# Altium footprint library Connector.PcbLib: 536 footprints (part 21 of 34)
Each footprint in its own frame and in the unit in brackets; x right, y up, seen from the top. Pads: shape width x height; smd on the part's side, far side on the other; paste and mask are expansions set on the pad; w line width, h text height; cw(c..) or ccw(c..) is an arc to the next point about the centre after c.
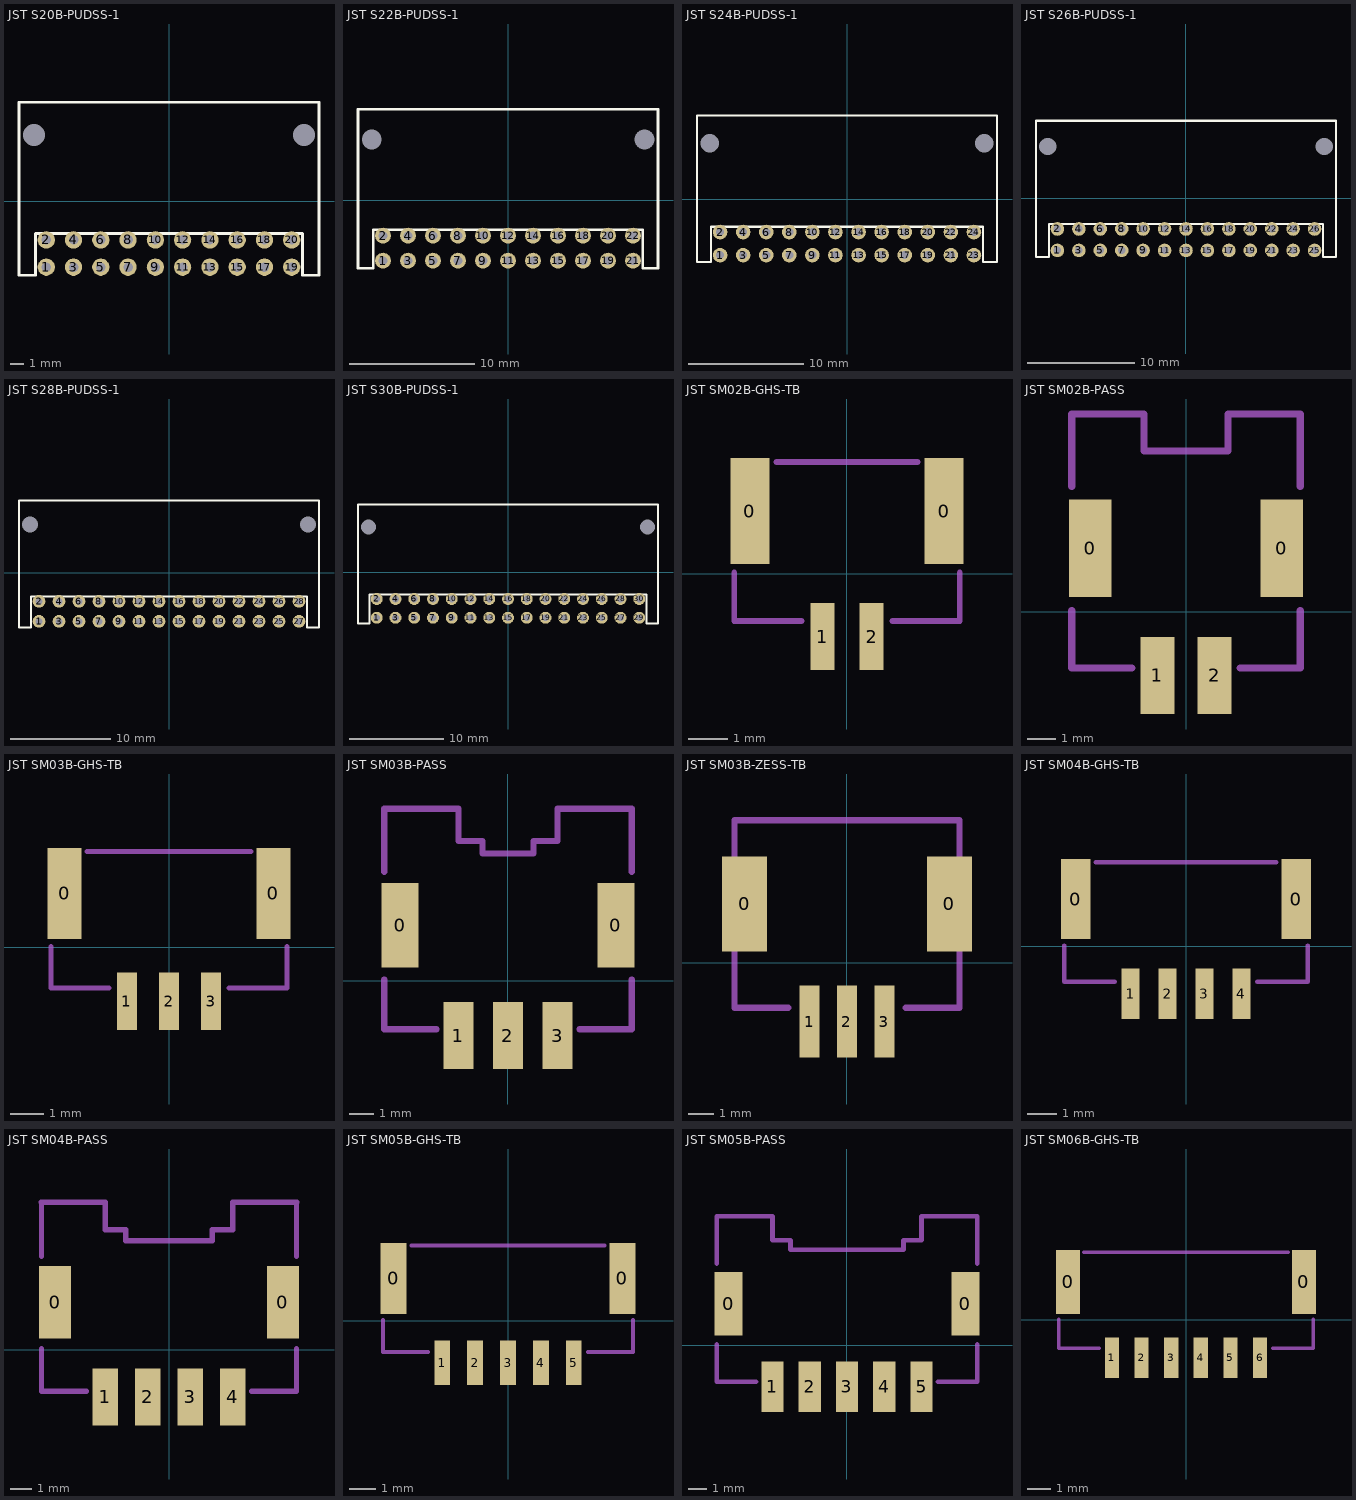
[diagram p20: the footprints below, top view; thin cyan lines are the x and y axes]

## JST S20B-PUDSS-1 [mm]
pads (22):
  round 0 hole 1.6: 0(-9.9,4.85) 0(9.9,4.85)
  round 1.27 hole 0.7: 1(-9,-4.85) 2(-9,-2.85) 3(-7,-4.85) 4(-7,-2.85) 5(-5,-4.85) 6(-5,-2.85) 7(-3,-4.85) 8(-3,-2.85) 9(-1,-4.85) 10(-1,-2.85) 11(1,-4.85) 12(1,-2.85) 13(3,-4.85) 14(3,-2.85) 15(5,-4.85) 16(5,-2.85) 17(7,-4.85) 18(7,-2.85) 19(9,-4.85) 20(9,-2.85)
Top Overlay:
  lines w0.203: -11,-5.45 -9.787,-5.45 -9.787,-2.386 9.787,-2.386 9.787,-5.45 11,-5.45 11,7.25 -11,7.25 -11,-5.45
3D body "S20B-PUDSS-1.STEP": height 8.52, standoff -2.98, extent -11,-5.45 11,7.25

## JST S22B-PUDSS-1 [mm]
pads (24):
  round 0 hole 1.6: 0(-10.9,4.85) 0(10.9,4.85)
  round 1.27 hole 0.7: 1(-10,-4.85) 2(-10,-2.85) 3(-8,-4.85) 4(-8,-2.85) 5(-6,-4.85) 6(-6,-2.85) 7(-4,-4.85) 8(-4,-2.85) 9(-2,-4.85) 10(-2,-2.85) 11(0,-4.85) 12(0,-2.85) 13(2,-4.85) 14(2,-2.85) 15(4,-4.85) 16(4,-2.85) 17(6,-4.85) 18(6,-2.85) 19(8,-4.85) 20(8,-2.85) 21(10,-4.85) 22(10,-2.85)
Top Overlay:
  lines w0.203: -12,-5.45 -10.787,-5.45 -10.787,-2.386 10.787,-2.386 10.787,-5.45 12,-5.45 12,7.25 -12,7.25 -12,-5.45
3D body "S22B-PUDSS-1.STEP": height 8.52, standoff -2.98, extent -12,-5.45 12,7.25

## JST S24B-PUDSS-1 [mm]
pads (26):
  round 0 hole 1.6: 0(-11.9,4.85) 0(11.9,4.85)
  round 1.27 hole 0.7: 1(-11,-4.85) 2(-11,-2.85) 3(-9,-4.85) 4(-9,-2.85) 5(-7,-4.85) 6(-7,-2.85) 7(-5,-4.85) 8(-5,-2.85) 9(-3,-4.85) 10(-3,-2.85) 11(-1,-4.85) 12(-1,-2.85) 13(1,-4.85) 14(1,-2.85) 15(3,-4.85) 16(3,-2.85) 17(5,-4.85) 18(5,-2.85) 19(7,-4.85) 20(7,-2.85) 21(9,-4.85) 22(9,-2.85) 23(11,-4.85) 24(11,-2.85)
Top Overlay:
  lines w0.203: -13,-5.45 -11.787,-5.45 -11.787,-2.386 11.787,-2.386 11.787,-5.45 13,-5.45 13,7.25 -13,7.25 -13,-5.45
3D body "S24B-PUDSS-1.STEP": height 8.52, standoff -2.98, extent -13,-5.45 13,7.25

## JST S26B-PUDSS-1 [mm]
pads (28):
  round 0 hole 1.6: 0(-12.9,4.85) 0(12.9,4.85)
  round 1.27 hole 0.7: 1(-12,-4.85) 2(-12,-2.85) 3(-10,-4.85) 4(-10,-2.85) 5(-8,-4.85) 6(-8,-2.85) 7(-6,-4.85) 8(-6,-2.85) 9(-4,-4.85) 10(-4,-2.85) 11(-2,-4.85) 12(-2,-2.85) 13(0,-4.85) 14(0,-2.85) 15(2,-4.85) 16(2,-2.85) 17(4,-4.85) 18(4,-2.85) 19(6,-4.85) 20(6,-2.85) 21(8,-4.85) 22(8,-2.85) 23(10,-4.85) 24(10,-2.85) 25(12,-4.85) 26(12,-2.85)
Top Overlay:
  lines w0.203: -14,-5.45 -14,7.25 14,7.25 14,-5.45 12.787,-5.45 12.787,-2.386 -12.787,-2.386 -12.787,-5.45 -14,-5.45
3D body "S26B-PUDSS-1.STEP": height 8.52, standoff -2.98, extent -14,-5.45 14,7.25

## JST S28B-PUDSS-1 [mm]
pads (30):
  round 0 hole 1.6: 0(-13.9,4.85) 0(13.9,4.85)
  round 1.27 hole 0.7: 1(-13,-4.85) 2(-13,-2.85) 3(-11,-4.85) 4(-11,-2.85) 5(-9,-4.85) 6(-9,-2.85) 7(-7,-4.85) 8(-7,-2.85) 9(-5,-4.85) 10(-5,-2.85) 11(-3,-4.85) 12(-3,-2.85) 13(-1,-4.85) 14(-1,-2.85) 15(1,-4.85) 16(1,-2.85) 17(3,-4.85) 18(3,-2.85) 19(5,-4.85) 20(5,-2.85) 21(7,-4.85) 22(7,-2.85) 23(9,-4.85) 24(9,-2.85) 25(11,-4.85) 26(11,-2.85) 27(13,-4.85) 28(13,-2.85)
Top Overlay:
  lines w0.203: -15,-5.45 -15,7.25 15,7.25 15,-5.45 13.787,-5.45 13.787,-2.386 -13.787,-2.386 -13.787,-5.45 -15,-5.45
3D body "S28B-PUDSS-1.STEP": height 8.52, standoff -2.98, extent -15,-5.45 15,7.25

## JST S30B-PUDSS-1 [mm]
pads (32):
  round 0 hole 1.6: 0(-14.9,4.85) 0(14.9,4.85)
  round 1.27 hole 0.7: 1(-14,-4.85) 2(-14,-2.85) 3(-12,-4.85) 4(-12,-2.85) 5(-10,-4.85) 6(-10,-2.85) 7(-8,-4.85) 8(-8,-2.85) 9(-6,-4.85) 10(-6,-2.85) 11(-4,-4.85) 12(-4,-2.85) 13(-2,-4.85) 14(-2,-2.85) 15(0,-4.85) 16(0,-2.85) 17(2,-4.85) 18(2,-2.85) 19(4,-4.85) 20(4,-2.85) 21(6,-4.85) 22(6,-2.85) 23(8,-4.85) 24(8,-2.85) 25(10,-4.85) 26(10,-2.85) 27(12,-4.85) 28(12,-2.85) 29(14,-4.85) 30(14,-2.85)
Top Overlay:
  lines w0.203: -16,-5.45 -14.787,-5.45 -14.787,-2.386 14.787,-2.386 14.787,-5.45 16,-5.45 16,7.25 -16,7.25 -16,-5.45
3D body "S30B-PUDSS-1.STEP": height 8.52, standoff -2.98, extent -16,-5.45 16,7.25

## JST SM02B-GHS-TB [mm]
pads (4):
  rect 1x2.7 smd: 0(-2.475,1.6) 0(2.475,1.6)
  rect 0.6x1.7 smd: 1(-0.625,-1.6) 2(0.625,-1.6)
Mechanical 15:
  lines w0.15: -2.875,0.031 -2.875,-1.2 -1.158,-1.2 ; -1.8,2.85 1.8,2.85 ; 1.158,-1.2 2.875,-1.2 2.875,0.031
3D body "SM02B-GHS-TB.STEP": height 4.35, standoff 0, extent -2.875,-2 2.875,2.85

## JST SM02B-PASS [mm]
pads (4):
  rect 1.5x3.4 smd: 0(-3.35,2.225) 0(3.35,2.225)
  rect 1.2x2.7 smd: 1(-1,-2.225) 2(1,-2.225)
Mechanical 15:
  lines w0.254: -4,6.919 -3.994,6.925 ; -3.994,0.042 -3.994,-1.965 -1.886,-1.965 ; -3.994,4.385 -3.994,6.925 ; 1.886,-1.965 3.994,-1.965 3.994,0.042 ; 3.994,4.385 3.994,6.925 ; -3.994,6.925 -1.473,6.925 -1.473,5.63 1.473,5.63 1.473,6.925 3.994,6.925 ; 3.994,6.925 4,6.919 3.994,6.925
3D body "SM02B-PASS-TB.STEP": height 5.8, standoff 0, extent -3.994,-3.075 4.006,6.925

## JST SM03B-GHS-TB [mm]
pads (5):
  rect 1x2.7 smd: 0(-3.1,1.6) 0(3.1,1.6)
  rect 0.6x1.7 smd: 1(-1.25,-1.6) 2(0,-1.6) 3(1.25,-1.6)
Mechanical 15:
  lines w0.15: -3.5,0.031 -3.5,-1.2 -1.783,-1.2 ; -2.425,2.85 1.175,2.85 ; -1.175,2.85 2.425,2.85 ; 1.783,-1.2 3.5,-1.2 3.5,0.031
3D body "SM03B-GHS-TB.STEP": height 4.35, standoff 0, extent -3.5,-2 3.5,2.85

## JST SM03B-PASS [mm]
pads (5):
  rect 1.5x3.4 smd: 0(-4.35,2.225) 0(4.35,2.225)
  rect 1.2x2.7 smd: 1(-2,-2.225) 2(0,-2.225) 3(2,-2.225)
Mechanical 15:
  lines w0.254: -5,6.919 -4.994,6.925 ; -4.994,0.042 -4.994,-1.965 -2.886,-1.965 ; -4.994,4.385 -4.994,6.925 ; 1.025,5.122 -1.032,5.122 -1.032,5.63 -1.997,5.63 -1.997,6.925 -4.994,6.925 ; 1.032,5.122 1.032,5.63 1.997,5.63 1.997,6.925 4.994,6.925 ; 2.886,-1.965 4.994,-1.965 4.994,0.042 ; 4.994,4.385 4.994,6.925 ; 5,6.919 4.994,6.925
3D body "SM03B-PASS-TB.STEP": height 5.8, standoff 0, extent -5,-3.075 5,6.925

## JST SM03B-ZESS-TB [mm]
pads (5):
  rect 1.8x3.8 smd: 0(-4.1,2.35) 0(4.1,2.35)
  rect 0.8x2.9 smd: 1(-1.5,-2.35) 2(0,-2.35) 3(1.5,-2.35)
Mechanical 15:
  lines w0.254: -2.35,-1.8 -4.5,-1.8 -4.5,5.7 4.5,5.7 4.5,-1.8 2.35,-1.8
3D body "SM03B-ZESS-TB.STEP": height 5.9, standoff 0, extent -4.5,-3 4.5,5.7

## JST SM04B-GHS-TB [mm]
pads (6):
  rect 1x2.7 smd: 0(-3.725,1.6) 0(3.725,1.6)
  rect 0.6x1.7 smd: 1(-1.875,-1.6) 2(-0.625,-1.6) 3(0.625,-1.6) 4(1.875,-1.6)
Mechanical 15:
  lines w0.15: -4.125,0.031 -4.125,-1.2 -2.408,-1.2 ; -3.05,2.85 0.55,2.85 ; -1.8,2.85 1.8,2.85 ; -0.55,2.85 3.05,2.85 ; 2.408,-1.2 4.125,-1.2 4.125,0.031
3D body "SM04B-GHS-TB.STEP": height 4.35, standoff 0, extent -4.125,-2 4.125,2.85

## JST SM04B-PASS [mm]
pads (6):
  rect 1.5x3.4 smd: 0(-5.35,2.225) 0(5.35,2.225)
  rect 1.2x2.7 smd: 1(-3,-2.225) 2(-1,-2.225) 3(1,-2.225) 4(3,-2.225)
Mechanical 15:
  lines w0.254: -6,6.919 -5.994,6.925 ; -5.994,0.042 -5.994,-1.965 -3.886,-1.965 ; -5.994,4.385 -5.994,6.925 ; 3.886,-1.965 5.994,-1.965 5.994,0.042 ; 5.994,4.385 5.994,6.925 ; 6,6.919 5.994,6.925 ; -5.994,6.925 -2.997,6.925 -2.997,5.63 -2.032,5.63 -2.032,5.122 2.032,5.122 2.032,5.63 2.997,5.63 2.997,6.925 5.994,6.925
3D body "SM04B-PASS-TB.STEP": height 5.8, standoff 0, extent -6,-3.075 6,6.925

## JST SM05B-GHS-TB [mm]
pads (7):
  rect 1x2.7 smd: 0(-4.35,1.6) 0(4.35,1.6)
  rect 0.6x1.7 smd: 1(-2.5,-1.6) 2(-1.25,-1.6) 3(0,-1.6) 4(1.25,-1.6) 5(2.5,-1.6)
Mechanical 15:
  lines w0.15: -4.75,0.031 -4.75,-1.2 -3.033,-1.2 ; -3.675,2.85 -0.075,2.85 ; -2.425,2.85 1.175,2.85 ; -1.175,2.85 2.425,2.85 ; 0.075,2.85 3.675,2.85 ; 3.033,-1.2 4.75,-1.2 4.75,0.031
3D body "SM05B-GHS-TB.STEP": height 4.35, standoff 0, extent -4.75,-2 4.75,2.85

## JST SM05B-PASS [mm]
pads (7):
  rect 1.5x3.4 smd: 0(-6.35,2.225) 0(6.35,2.225)
  rect 1.2x2.7 smd: 1(-4,-2.225) 2(-2,-2.225) 3(0,-2.225) 4(2,-2.225) 5(4,-2.225)
Mechanical 15:
  lines w0.254: -6.994,0.042 -6.994,-1.965 -4.886,-1.965 ; -6.994,4.385 -6.994,6.925 ; -6.994,6.919 -6.989,6.925 -3.997,6.925 -3.997,5.63 -3.032,5.63 -3.032,5.122 3.032,5.122 3.032,5.63 3.997,5.63 3.997,6.925 6.989,6.925 6.994,6.919 ; 4.886,-1.965 6.994,-1.965 6.994,0.042 ; 6.994,4.385 6.994,6.925
3D body "SM05B-PASS-TB.STEP": height 5.8, standoff 0, extent -6.994,-3.081 7.006,6.919

## JST SM06B-GHS-TB [mm]
pads (8):
  rect 1x2.7 smd: 0(-4.975,1.6) 0(4.975,1.6)
  rect 0.6x1.7 smd: 1(-3.125,-1.6) 2(-1.875,-1.6) 3(-0.625,-1.6) 4(0.625,-1.6) 5(1.875,-1.6) 6(3.125,-1.6)
Mechanical 15:
  lines w0.15: -5.375,0.031 -5.375,-1.2 -3.658,-1.2 ; -4.3,2.85 -0.7,2.85 ; -3.05,2.85 0.55,2.85 ; -1.8,2.85 1.8,2.85 ; -0.55,2.85 3.05,2.85 ; 0.7,2.85 4.3,2.85 ; 3.658,-1.2 5.375,-1.2 5.375,0.031
3D body "SM06B-GHS-TB.STEP": height 4.35, standoff 0, extent -5.375,-2 5.375,2.85